# Altium footprint library Horizont_11_12_2017.PcbLib: 257 footprints (part 8 of 17)
Each footprint in its own frame and in the unit in brackets; x right, y up, seen from the top. Pads: shape width x height; smd on the part's side, far side on the other; paste and mask are expansions set on the pad; w line width, h text height; cw(c..) or ccw(c..) is an arc to the next point about the centre after c.
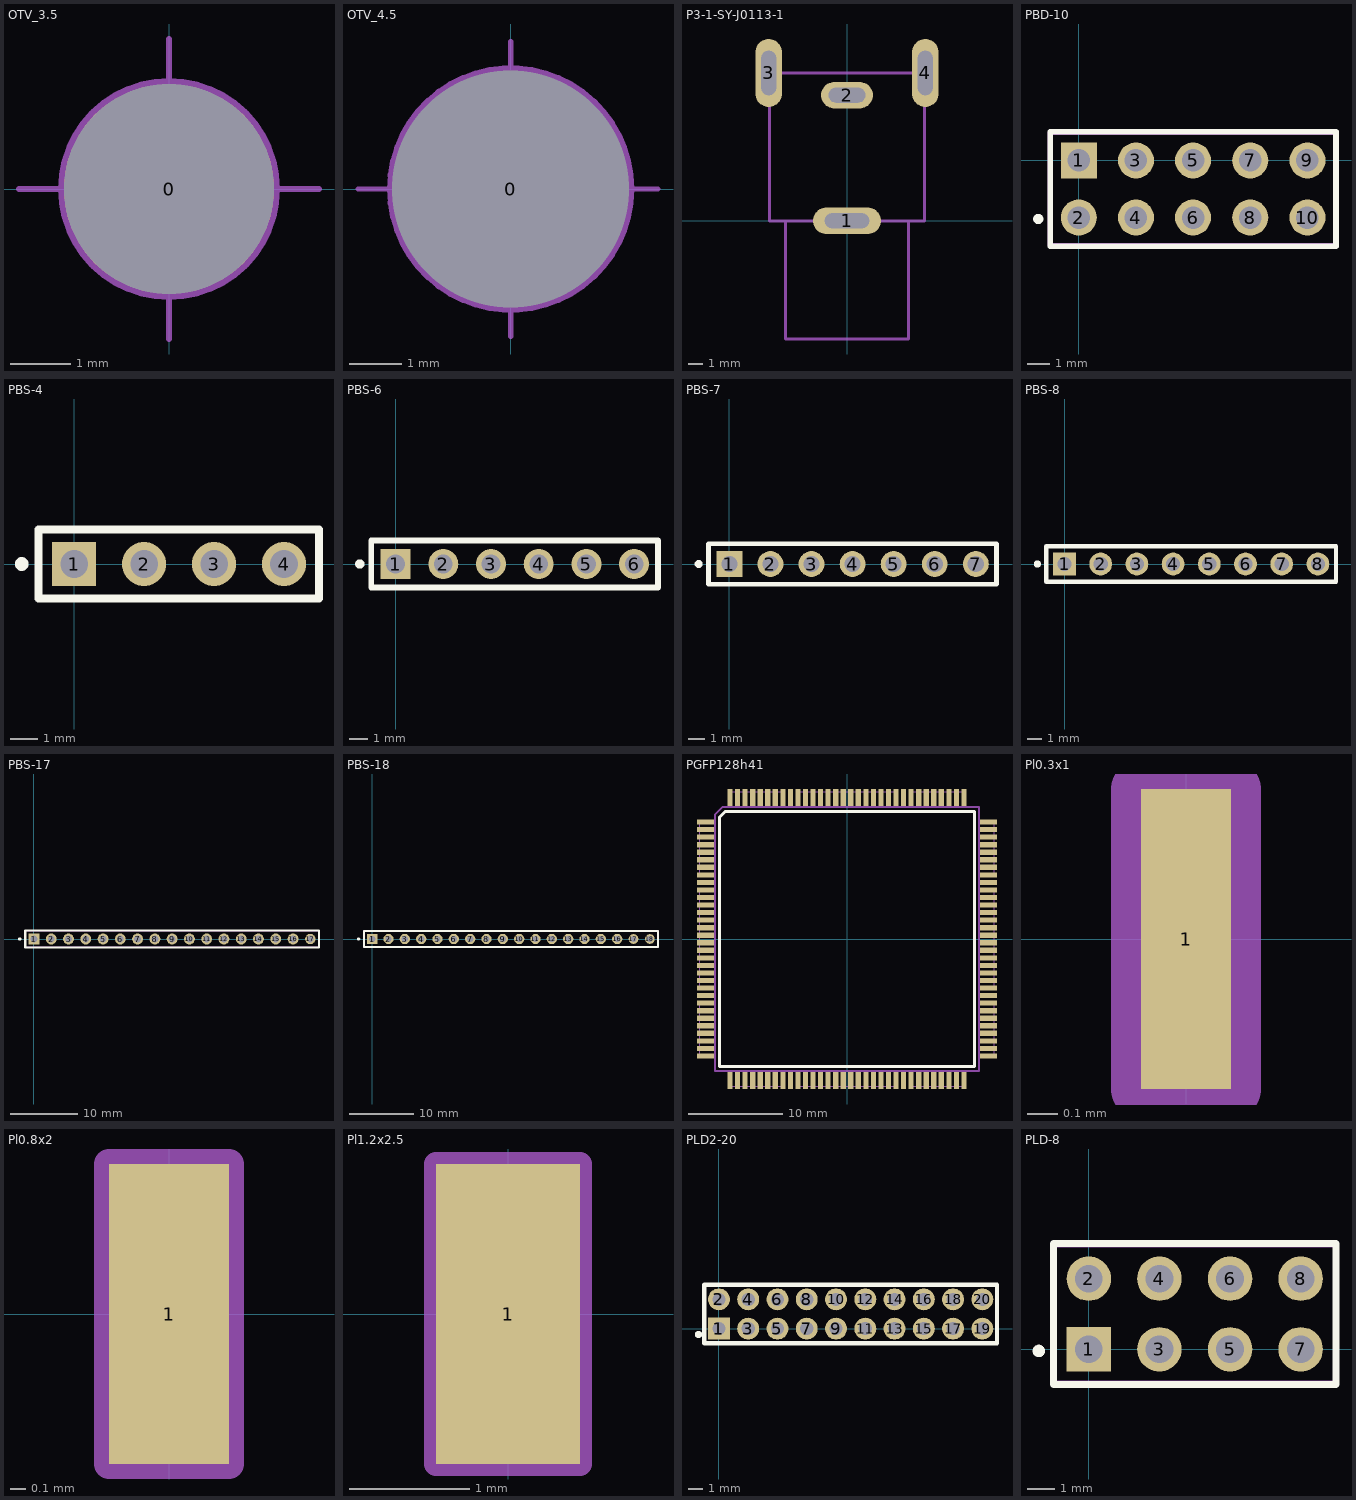
[diagram p7: the footprints below, top view; thin cyan lines are the x and y axes]

## OTV_3.5 [mm]
pads (1):
  round 3.5 hole 3.5 unplated mask+1.5: 0(0,0)
Mechanical 1:
  circle w0.2: c0,0 r1.75
  lines w0.1: -2.5,0 2.5,0 ; 0,-2.5 0,2.5
Mechanical 2:
  circle w0.2: c0,0 r1.75
  lines w0.1: -2.5,0 2.5,0 ; 0,-2.5 0,2.5

## OTV_4.5 [mm]
pads (1):
  round 3.5 hole 4.5 unplated mask+2: 0(0,0)
Mechanical 1:
  circle w0.2: c0,0 r2.25
  lines w0.1: -2.9,0 2.8,0 ; 0,-2.8 0,2.8
Mechanical 2:
  circle w0.2: c0,0 r2.25
  lines w0.1: -2.9,0 2.8,0 ; 0,-2.8 0,2.7

## P3-1-SY-J0113-1 [mm]
height 15
pads (4):
  oval 4.6x1.8 hole 1 slot 3 at 0 deg: 1(0,0)
  oval 3.5x1.8 hole 1 slot 2.5 at 0 deg: 2(0,8.5)
  oval 1.8x4.6 hole 1 slot 3 at 90 deg: 3(-5.3,10) 4(5.3,10)
Mechanical 1:
  lines w0.2: -4.15,0 -4.15,-8 4.15,-8 4.15,0 ; -5.25,0 -5.25,10 5.25,10 5.25,0 -5.25,0
  text "4" at 3.4,8.4 h1.5
  text "3" at -4.05,8.3 h1.5
  text "1" at -0.2,1.1 h1.5
  text ".Designator" at -0.9,5.25 h1.5
  text "2" at -0.1,7.75 h1.5
3D body "P3-1-SY-J0113-1.stp": height 13, standoff -3.5, extent -5.55,-8.25 5.55,11

## PBD-10 [mm]
height 8.4
pads (10):
  rect 1.6x1.6 hole 1: 1(0,0)
  round 1.6 hole 1: 2(0,-2.54) 3(2.54,0) 4(2.54,-2.54) 5(5.08,0) 6(5.08,-2.54) 7(7.62,0) 8(7.62,-2.54) 9(10.16,0) 10(10.16,-2.54)
Top Overlay:
  circle w0.25: c-1.8,-2.6 r0.1
  lines w0.25: -1.27,-3.81 11.43,-3.81 11.43,1.27 -1.27,1.27 -1.27,-3.81
Mechanical 1:
  lines w0.2: -1.28,-3.77 11.43,-3.77 11.43,1.23 -1.28,1.23 -1.28,-3.77
  text "9" at 9.485,-0.41 h1.5
  text "1" at -0.054,-0.462 h1.5
  text "10" at 9.503,-3.002 h1.5
  text "2" at -0.308,-3.002 h1.5
  text ".Designator" at 3.92,-1.52 h1.5
3D body "PBD-10.stp": height 8.4, standoff -3, extent -1.27,-3.81 11.43,1.27

## PBS-4 [mm]
height 8.4
pads (4):
  rect 1.6x1.6 hole 1: 1(0,0)
  round 1.6 hole 1: 2(2.54,0) 3(5.08,0) 4(7.62,0)
Top Overlay:
  circle w0.3: c-1.9,0 r0.1
  lines w0.3: -1.29,-1.25 -1.29,1.25 8.89,1.25 8.89,-1.25 -1.29,-1.25
Mechanical 1:
  lines w0.2: -1.29,-1.25 -1.29,1.25 8.89,1.25 8.89,-1.25 -1.29,-1.25
  text "1" at -0.254,-0.508 h1.5
  text "4" at 7.239,-0.381 h1.5
  text ".Designator" at 2.667,1.905 h1.5
3D body "PBS-4.stp": height 8.4, standoff -3, extent -1.27,-1.27 8.89,1.27

## PBS-6 [mm]
height 8.4
pads (6):
  rect 1.6x1.6 hole 1: 1(0,0)
  round 1.6 hole 1: 2(2.54,0) 3(5.08,0) 4(7.62,0) 5(10.16,0) 6(12.7,0)
Top Overlay:
  circle w0.3: c-1.9,0 r0.1
  lines w0.3: -1.29,-1.25 13.97,-1.25 13.97,1.25 -1.29,1.25 -1.29,-1.25
Mechanical 1:
  lines w0.2: -1.29,-1.25 13.97,-1.25 13.97,1.25 -1.29,1.25 -1.29,-1.25
  text ".Designator" at 3.6,1.9 h1.5
  text "6" at 12.446,-0.381 h1.5
  text "1" at -0.254,-0.508 h1.5
3D body "PBS-6.stp": height 8.4, standoff -3, extent -1.27,-1.27 13.97,1.27

## PBS-7 [mm]
height 8.4
pads (7):
  rect 1.6x1.6 hole 1: 1(0,0)
  round 1.6 hole 1: 2(2.54,0) 3(5.08,0) 4(7.62,0) 5(10.16,0) 6(12.7,0) 7(15.24,0)
Top Overlay:
  circle w0.3: c-1.9,0 r0.1
  lines w0.3: -1.29,-1.25 -1.29,1.25 16.51,1.25 16.51,-1.25 -1.29,-1.25
Mechanical 1:
  lines w0.2: -1.29,-1.25 16.55,-1.25 16.55,1.25 -1.29,1.25 -1.29,-1.25
  text "1" at -0.254,-0.508 h1.5
  text "7" at 14.9,-0.45 h1.5
  text ".Designator" at 6.9,-0.2 h1.5
3D body "PBS-7.stp": height 8.4, standoff -3, extent -1.27,-1.27 16.51,1.27

## PBS-8 [mm]
height 8.4
pads (8):
  rect 1.6x1.6 hole 1: 1(0,0)
  round 1.6 hole 1: 2(2.54,0) 3(5.08,0) 4(7.62,0) 5(10.16,0) 6(12.7,0) 7(15.24,0) 8(17.78,0)
Top Overlay:
  circle w0.3: c-1.9,0 r0.1
  lines w0.3: -1.29,-1.25 19.05,-1.25 19.05,1.25 -1.29,1.25 -1.29,-1.25
Mechanical 1:
  lines w0.2: -1.29,-1.25 19.05,-1.25 19.05,1.25 -1.29,1.25 -1.29,-1.25
  text ".Designator" at 7.5,-0.4 h1.5
  text "8" at 17.78,-0.635 h1.5
  text "1" at -0.254,-0.508 h1.5
3D body "PBS-8.stp": height 8.4, standoff -3, extent -1.27,-1.27 19.05,1.27

## PBS-17 [mm]
height 8.4
pads (17):
  rect 1.6x1.6 hole 1: 1(0,0)
  round 1.6 hole 1: 2(2.54,0) 3(5.08,0) 4(7.62,0) 5(10.16,0) 6(12.7,0) 7(15.24,0) 8(17.78,0) 9(20.32,0) 10(22.86,0) 11(25.4,0) 12(27.94,0) 13(30.48,0) 14(33.02,0) 15(35.56,0) 16(38.1,0)
  round 1.524 hole 0.965: 17(40.64,0)
Top Overlay:
  circle w0.3: c-2.1,0 r0.1
  lines w0.3: -1.28,-1.25 41.92,-1.25 41.92,1.25 -1.28,1.25 -1.28,-1.25
Mechanical 1:
  lines w0.2: -1.28,-1.25 -1.28,1.25 41.92,1.25 41.92,-1.25 -1.28,-1.25
  text "1" at -0.128,-0.257 h1.5
  text "17" at 40.116,-0.257 h1.5
  text ".Designator" at 16.61,-0.22 h1.5
3D body "PBS-17.stp": height 8.4, standoff -3, extent -1.27,-1.27 41.91,1.27

## PBS-18 [mm]
height 8.4
pads (18):
  rect 1.6x1.6 hole 1: 1(0,0)
  round 1.6 hole 1: 2(2.54,0) 3(5.08,0) 4(7.62,0) 5(10.16,0) 6(12.7,0) 7(15.24,0) 8(17.78,0) 9(20.32,0) 10(22.86,0) 11(25.4,0) 12(27.94,0) 13(30.48,0) 14(33.02,0) 15(35.56,0) 16(38.1,0)
  round 1.524 hole 0.965: 17(40.64,0) 18(43.18,0)
Top Overlay:
  circle w0.3: c-2.1,0 r0.1
  lines w0.3: -1.28,-1.25 -1.28,1.25 44.45,1.25 44.45,-1.25 -1.28,-1.25
Mechanical 1:
  lines w0.2: -1.28,-1.25 44.45,-1.25 44.45,1.25 -1.28,1.25 -1.28,-1.25
  text ".Designator" at 16.61,-0.22 h1.5
  text "18" at 42.656,-0.257 h1.5
  text "1" at -0.128,-0.257 h1.5
3D body "PBS-18.stp": height 8.4, standoff -3, extent -1.27,-1.27 44.45,1.27

## PGFP128h41 [mm]
height 4.1
pads (128):
  rect 1.8x0.55 smd: 1(-15,12.4) 2(-15,11.6) 3(-15,10.8) 4(-15,10) 5(-15,9.2) 6(-15,8.4) 7(-15,7.6) 8(-15,6.8) 9(-15,6) 10(-15,5.2) 11(-15,4.4) 12(-15,3.6) 13(-15,2.8) 14(-15,2) 15(-15,1.2) 16(-15,0.4) 17(-15,-0.4) 18(-15,-1.2) 19(-15,-2) 20(-15,-2.8) 21(-15,-3.6) 22(-15,-4.4) 23(-15,-5.2) 24(-15,-6) 25(-15,-6.8) 26(-15,-7.6) 27(-15,-8.4) 28(-15,-9.2) 29(-15,-10) 30(-15,-10.8) 31(-15,-11.6) 32(-15,-12.4) 65(15,-12.4) 66(15,-11.6) 67(15,-10.8) 68(15,-10) 69(15,-9.2) 70(15,-8.4) 71(15,-7.6) 72(15,-6.8) 73(15,-6) 74(15,-5.2) 75(15,-4.4) 76(15,-3.6) 77(15,-2.8) 78(15,-2) 79(15,-1.2) 80(15,-0.4) 81(15,0.4) 82(15,1.2) 83(15,2) 84(15,2.8) 85(15,3.6) 86(15,4.4) 87(15,5.2) 88(15,6) 89(15,6.8) 90(15,7.6) 91(15,8.4) 92(15,9.2) 93(15,10) 94(15,10.8) 95(15,11.6) 96(15,12.4)
  rect 0.55x1.8 smd: 33(-12.4,-15) 34(-11.6,-15) 35(-10.8,-15) 36(-10,-15) 37(-9.2,-15) 38(-8.4,-15) 39(-7.6,-15) 40(-6.8,-15) 41(-6,-15) 42(-5.2,-15) 43(-4.4,-15) 44(-3.6,-15) 45(-2.8,-15) 46(-2,-15) 47(-1.2,-15) 48(-0.4,-15) 49(0.4,-15) 50(1.2,-15) 51(2,-15) 52(2.8,-15) 53(3.6,-15) 54(4.4,-15) 55(5.2,-15) 56(6,-15) 57(6.8,-15) 58(7.6,-15) 59(8.4,-15) 60(9.2,-15) 61(10,-15) 62(10.8,-15) 63(11.6,-15) 64(12.4,-15) 97(12.4,15) 98(11.6,15) 99(10.8,15) 100(10,15) 101(9.2,15) 102(8.4,15) 103(7.6,15) 104(6.8,15) 105(6,15) 106(5.2,15) 107(4.4,15) 108(3.6,15) 109(2.8,15) 110(2,15) 111(1.2,15) 112(0.4,15) 113(-0.4,15) 114(-1.2,15) 115(-2,15) 116(-2.8,15) 117(-3.6,15) 118(-4.4,15) 119(-5.2,15) 120(-6,15) 121(-6.8,15) 122(-7.6,15) 123(-8.4,15) 124(-9.2,15) 125(-10,15) 126(-10.8,15) 127(-11.6,15) 128(-12.4,15)
Top Overlay:
  lines w0.3: -13.5,-13.5 -13.5,12.9 -12.9,13.5 13.5,13.5 13.5,-13.5 -13.5,-13.5
Mechanical 1:
  lines w0.1: -15.6,-12.4 -15.6,-6.8 ; -15.6,-6.1 -15.6,-5.9 ; -15.6,-5.2 -15.6,5.2 ; -15.6,5.9 -15.6,6.1 ; -15.6,6.8 -15.6,12.4 ; -12.4,-15.6 -6.8,-15.6 ; -12.4,15.6 -6.8,15.6 ; -6.1,-15.6 -5.9,-15.6 ; -6.1,15.6 -5.9,15.6 ; -5.2,-15.6 5.2,-15.6 ; -5.2,15.6 5.2,15.6 ; 5.9,-15.6 6.1,-15.6 ; 5.9,15.6 6.1,15.6 ; 6.8,-15.6 12.4,-15.6 ; 6.8,15.6 12.4,15.6 ; 15.6,-12.4 15.6,-6.8 ; 15.6,-6.1 15.6,-5.9 ; 15.6,-5.2 15.6,5.2 ; 15.6,5.9 15.6,6.1 ; 15.6,6.8 15.6,12.4
  lines w0.2: -15.6,-12.4 -14,-12.4 ; -15.6,12.4 -14,12.4 ; -12.4,-15.6 -12.4,-14 ; -12.4,14 -12.4,15.6 ; 12.4,-15.6 12.4,-14 ; 12.4,14 12.4,15.6 ; 14,-12.4 15.6,-12.4 ; 14,12.4 15.6,12.4 ; -14,-14 -14,13.178 -13.178,14 14,14 14,-14 -14,-14
  text "97" at 10.9,12.5 h1.5
  text "96" at 13.2,11.1 h1.5
  text "65" at 13.2,-12.2 h1.5
  text "64" at 11.1,-13.4 h1.5
  text "128" at -13,12.6 h1.5
  text "1" at -12.6,11.8 h1.5
  text "32" at -12.5,-12 h1.5
  text "33" at -12.624,-13.257 h1.5
  text ".Designator" at -1.61,0.85 h1.5
  text ".Comment" at -2.9,-1.7 h1.5
3D body "PQFP128h41.stp": height 4.12, standoff 0, extent -15.6,-15.6 15.6,15.6

## Pl0.3x1 [mm]
pads (1):
  rect 0.3x1 smd: 1(0,0)
Mechanical 1:
  lines w0.2: -0.15,-0.5 0.15,-0.5 0.15,0.5 -0.15,0.5 -0.15,-0.5
  text ".Designator" at -0.51,1.02 h1.5

## Pl0.8x2 [mm]
pads (1):
  rect 0.8x2 smd: 1(0,0)
Mechanical 1:
  lines w0.2: -0.4,-1 -0.4,1 0.4,1 0.4,-1 -0.4,-1
  text ".Designator" at -0.82,1.75 h1.5
Mechanical 2:
  lines w0.2: -0.4,-1 -0.4,1 0.4,1 0.4,-1 -0.4,-1

## Pl1.2x2.5 [mm]
pads (1):
  rect 1.2x2.5 smd: 1(0,0)
Mechanical 1:
  lines w0.2: -0.6,-1.25 0.6,-1.25 0.6,1.25 -0.6,1.25 -0.6,-1.25
  text ".Designator" at -0.87,1.85 h1.5
Mechanical 2:
  lines w0.2: -0.6,-1.25 0.6,-1.25 0.6,1.25 -0.6,1.25 -0.6,-1.25

## PLD2-20 [mm]
height 6.5
pads (20):
  rect 1.5x1.5 hole 0.9: 1(0,0)
  round 1.5 hole 0.9: 2(0,2) 3(2,0) 4(2,2) 5(4,0) 6(4,2) 7(6,0) 8(6,2) 9(8,0) 10(8,2) 11(10,0) 12(10,2) 13(12,0) 14(12,2) 15(14,0) 16(14,2) 17(16,0) 18(16,2) 19(18,0) 20(18,2)
Top Overlay:
  circle w0.3: c-1.4,-0.4 r0.1
  lines w0.3: -1,-1 -1,3 19,3 19,-1 -1,-1
Mechanical 1:
  lines w0.2: -1,-1 -1,3 19,3 19,-1 -1,-1
  text ".Designator" at 8,3.6 h1.5
  text "19" at 17.4,-0.6 h1.5
  text "1" at -0.5,-0.5 h1.5
  text "20" at 17.4,1.5 h1.5
  text "2" at -0.5,1.5 h1.5
3D body "СНП377-20ВП21-2.STEP": height 5.5, standoff -3, extent -1,-1 19,3

## PLD-8 [mm]
height 8.8
pads (8):
  rect 1.6x1.6 hole 1: 1(0,0)
  round 1.6 hole 1: 2(0,2.54) 3(2.54,0) 4(2.54,2.54) 5(5.08,0) 6(5.08,2.54) 7(7.62,0) 8(7.62,2.54)
Top Overlay:
  circle w0.25: c-1.8,-0.06 r0.1
  lines w0.25: -1.27,-1.27 8.89,-1.27 8.89,3.81 -1.27,3.81 -1.27,-1.27
Mechanical 1:
  lines w0.2: -1.28,-1.23 8.89,-1.23 8.89,3.77 -1.28,3.77 -1.28,-1.23
  text "7" at 7.025,-0.41 h1.5
  text "1" at -0.254,-0.762 h1.5
  text "8" at 7.043,2.078 h1.5
  text "2" at -0.508,1.778 h1.5
  text ".Designator" at 1.397,0.889 h1.5
3D body "PLD-8.stp": height 8.8, standoff -3, extent -1.27,-1.27 8.89,3.81